# Altium footprint library VEGG_PcbLib_ALT.PcbLib: 140 footprints (part 7 of 9)
Each footprint in its own frame and in the unit in brackets; x right, y up, seen from the top. Pads: shape width x height; smd on the part's side, far side on the other; paste and mask are expansions set on the pad; w line width, h text height; cw(c..) or ccw(c..) is an arc to the next point about the centre after c.
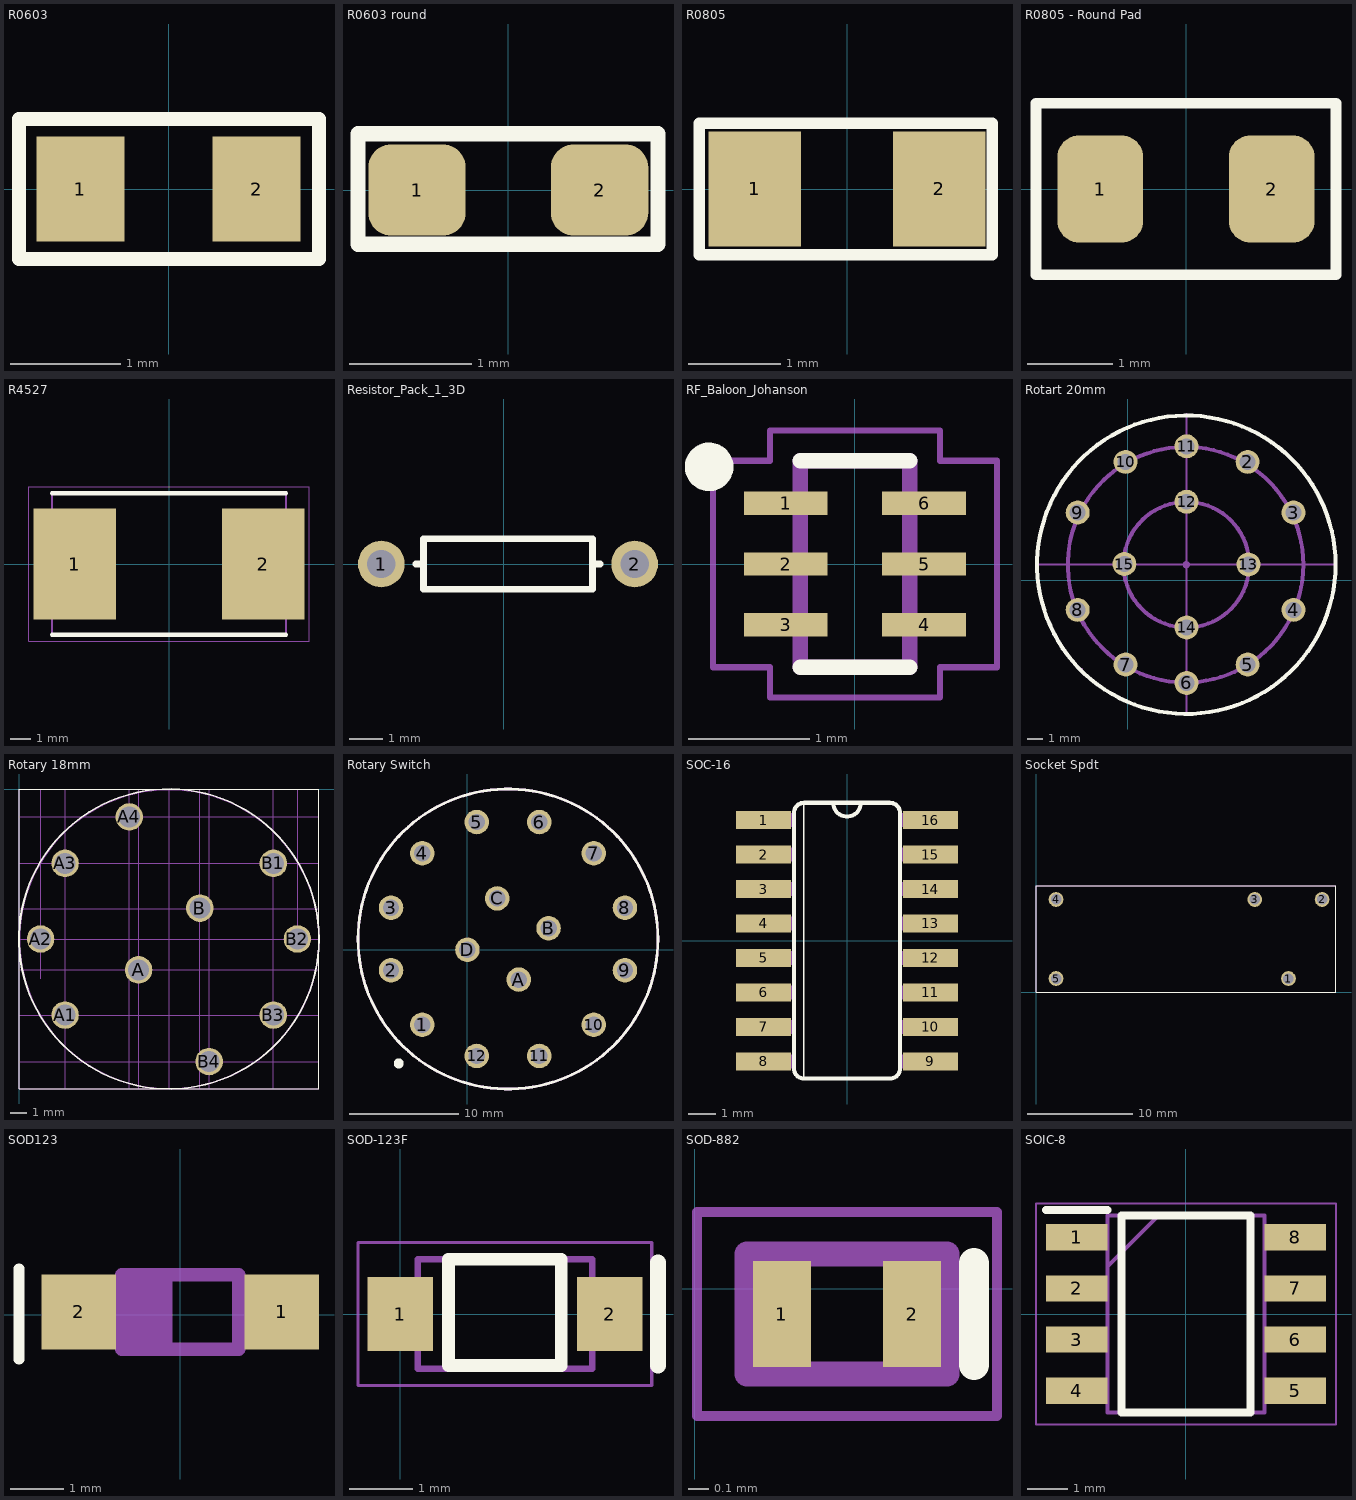
[diagram p6: the footprints below, top view; thin cyan lines are the x and y axes]

## R0603 [mm]
pads (2):
  rect 0.8x0.95 smd: 1(-0.8,0) 2(0.8,0)
Top Overlay:
  lines w0.125: -1.359,-0.635 -1.359,0.635 1.367,0.635 1.367,-0.635 -1.359,-0.635
3D body "SMD R-0603.STEP": height 0.45, standoff -0.01, extent -0.8,-0.4 0.8,0.4

## R0603 round [mm]
pads (2):
  rrect50% 0.8x0.75 smd: 1(-0.75,0) 2(0.75,0)
Top Overlay:
  lines w0.125: -1.235,-0.446 1.23,-0.446 1.23,0.463 -1.235,0.463 -1.235,-0.446
3D body "SMD R-0603.STEP": height 0.45, standoff -0.01, extent -0.8,-0.4 0.8,0.4

## R0805 [mm]
pads (2):
  rect 1x1.25 smd: 1(-1,0) 2(1,0)
Top Overlay:
  lines w0.125: -1.6,-0.711 1.575,-0.711 1.575,0.711 -1.6,0.711 -1.6,-0.711
3D body "R-0805.STEP": height 0.6, standoff 0, extent -1,-0.625 1,0.625

## R0805 - Round Pad [mm]
pads (2):
  rrect50% 1x1.25 smd: 1(-1,0) 2(1,0)
Top Overlay:
  lines w0.125: -1.75,-1 1.75,-1 1.75,1 -1.75,1 -1.75,-1
3D body "R-0805.STEP": height 0.6, standoff 0, extent -1,-0.625 1,0.625

## R4527 [mm]
pads (2):
  rect 4.05x5.5 smd: 1(-4.65,0) 2(4.65,0)
Top Overlay:
  lines w0.2: -5.78,-3.49 5.78,-3.49 ; -5.78,3.49 5.78,3.49
Mechanical 13:
  lines w0.1: -5.78,-3.49 -5.78,3.49 5.78,3.49 5.78,-3.49 -5.78,-3.49
Mechanical 15:
  lines w0.05: -6.925,-3.804 -6.925,3.804 6.925,3.804 6.925,-3.804 -6.925,-3.804
3D body "WSR5R0100FEA.stp": height 2.54, standoff 0, extent -5.78,-3.49 5.78,3.49

## Resistor_Pack_1_3D [mm] "Axial 0.3"
pads (2):
  round 1.4 hole 0.85: 1(-3.683,0) 2(3.937,0)
Top Overlay:
  lines w0.2: -2.642,0 -2.413,0 ; 2.896,0 2.667,0 ; 2.667,0 2.667,0.762 -2.413,0.762 -2.413,-0.762 2.667,-0.762 2.667,0
3D body "User Library-Resistencia-1.STEP": height 3.51, standoff 0, extent -3.937,-0.971 4.191,0.971

## RF_Baloon_Johanson [mm] "for M-Bus Project"
pads (6):
  rect 0.69x0.19 smd: 1(-0.57,0.5) 2(-0.57,0) 3(-0.57,-0.5) 4(0.57,-0.5) 5(0.57,0) 6(0.57,0.5)
Top Overlay:
  circle w0.2: c-1.2,0.8 r0.1
  lines w0.127: -0.45,-0.85 0.45,-0.85 ; -0.45,0.85 0.45,0.85
Mechanical 4:
  lines w0.127: -0.45,-0.85 -0.45,0.85 ; -0.45,-0.85 0.45,-0.85 ; -0.45,-0.85 -0.45,0.85 ; -0.45,-0.85 0.45,-0.85 ; -0.45,0.85 0.45,0.85 ; -0.45,0.85 0.45,0.85 ; 0.45,-0.85 0.45,0.85 ; 0.45,-0.85 0.45,0.85
Mechanical 16:
  lines w0.05: -1.17,-0.85 -0.7,-0.85 -0.7,-1.1 0.7,-1.1 0.7,-0.85 1.17,-0.85 1.17,0.85 0.7,0.85 0.7,1.1 -0.7,1.1 -0.7,0.85 -1.17,0.85 -1.17,-0.85
3D body: height 0.6, standoff 0, extent -0.406,-0.8 0.406,0.8

## Rotart 20mm [mil]
pads (14):
  round 60 hole 40: 2(300,297) 3(415,170) 4(415,-74) 5(300,-211) 6(147,-257) 7(-6,-211) 8(-126,-74) 9(-126,170) 10(-6,297) 11(147,336) 12(147,197) 13(302,40) 14(147,-118) 15(-9,41)
Top Overlay:
  circle w10: c146.41,39.23 r374.02
Mechanical 1:
  lines w5: -230,40 521,40 147,40 ; -116,-222 -115,-222 ; 146,40 147,40 ; 147,-335 147,417 147,40 ; 149,40 147,40 ; 412,-223 412,-221
Mechanical 15:
  circle w10: c146.41,39.23 r3.94
  circle w10: c146.41,39.23 r157.48
  circle w10: c144.41,39.23 r295.28
3D body: height 984.25, standoff 511.81, extent 46.56,-61.3 243.41,135.3
3D body: height 437.01, standoff 3.94, extent -229.03,-336.89 519,410.89
3D body: height 94.49, standoff 0, extent -297,345 -297,345
3D body: height 94.49, standoff 0, extent -249,388 -249,388
3D body: height 539.37, standoff 440.94, extent -112.9,-217.9 398.91,293.91

## Rotary 18mm [mil] "2 Pole 5 Position"
pads (10):
  round 65 hole 50: A(282,-427) A1(108,-534) A2(50,-354) A3(108,-175) A4(260,-65) B(427,-281) B1(601,-175) B2(658,-354) B3(601,-534) B4(449,-644)
Top Overlay:
  circle w3.94: c354,-354 r355
  lines w1: 0,-709 709,-709 709,0 0,0 0,-709
Mechanical 4:
  circle w3.94: c354.5,-354.5 r354.33
  lines w1: 0,-644 709,-644 ; 0,-534 709,-534 ; 0,-427 709,-427 ; 0,-354.5 709,-354.5 ; 0,-282 709,-282 ; 0,-175 709,-175 ; 0,-65 709,-65 ; 50,-448 50,0 ; 108,-709 108,0 ; 260,-709 260,0 ; 282,-709 282,0 ; 354.5,-709 354.5,0 ; 427,-709 427,0 ; 449,-709 449,0 ; 601,-709 601,0 ; 659,-367 659,0 ; 0,-709 0,0 709,0 709,-709 0,-709
3D body: height 379, standoff 5, extent -0.99,-707.87 707.01,-0.12

## Rotary Switch [mm] "2x6 position"
pads (16):
  round 2.25 hole 1.5: 1(-4.13,-6.852) 2(-7.003,-1.876) 3(-7.003,3.869) 4(-4.13,8.845) 5(0.846,11.718) 6(6.592,11.718) 7(11.568,8.845) 8(14.441,3.869) 9(14.441,-1.876) 10(11.568,-6.852) 11(6.592,-9.725) 12(0.846,-9.725) A(4.715,-2.722) B(7.438,1.993) C(2.722,4.715) D(0,0)
Top Overlay:
  circle w0.254: c3.719,0.996 r13.75
  circle w0.5: c-6.3,-10.407 r0.204
Mechanical 15:
  circle w0.254: c3.719,0.996 r13.75
3D body "Stufenschalter 2x6.step": height 62.8, standoff -4, extent -14.1,-16.975 21.684,18.811

## SOC-16 [mil]
height 51.18
pads (16):
  rect 80x26 smd: 1(-121,175) 2(-121,125) 3(-121,75) 4(-121,25) 5(-121,-25) 6(-121,-75) 7(-121,-125) 8(-121,-175) 9(121,-175) 10(121,-125) 11(121,-75) 12(121,-25) 13(121,25) 14(121,75) 15(121,125) 16(121,175)
Top Overlay:
  lines w2: -63,-200 -63,200
  lines w6: -20,200 ccw(c0,200) 20,200 ; -77,-185 ccw(c-62,-185) -62,-200 62,-200 ccw(c62,-185) 77,-185 77,185 ccw(c62,185) 62,200 -62,200 ccw(c-62,185) -77,185 -77,-185
Mechanical 4:
  region: 122,-165 122,-185 77,-185 77,-165
  region: 122,-115 122,-135 77,-135 77,-115
  region: 122,-65 122,-85 77,-85 77,-65
  region: 122,-15 122,-35 77,-35 77,-15
  region: -77,-165 -77,-185 -122,-185 -122,-165
  region: -77,-115 -77,-135 -122,-135 -122,-115
  region: -77,-65 -77,-85 -122,-85 -122,-65
  region: -77,-15 -77,-35 -122,-35 -122,-15
  region: 122,185 122,165 77,165 77,185
  region: 122,135 122,115 77,115 77,135
  region: 122,85 122,65 77,65 77,85
  region: -77,35 -77,15 -122,15 -122,35
  region: -76,85 -76,65 -121,65 -121,85
  region: -77,135 -77,115 -122,115 -122,135
  region: -77,185 -77,165 -122,165 -122,185
  region: 122,35 122,15 77,15 77,35
  region: 122,-165 122,-185 77,-185 77,-165
  region: 122,-115 122,-135 77,-135 77,-115
  region: 122,-65 122,-85 77,-85 77,-65
  region: 122,-15 122,-35 77,-35 77,-15
  region: -77,-165 -77,-185 -122,-185 -122,-165
  region: -77,-115 -77,-135 -122,-135 -122,-115
  region: -77,-65 -77,-85 -122,-85 -122,-65
  region: -77,-15 -77,-35 -122,-35 -122,-15
  region: 122,185 122,165 77,165 77,185
  region: 122,135 122,115 77,115 77,135
  region: 122,85 122,65 77,65 77,85
  region: -77,35 -77,15 -122,15 -122,35
  region: -76,85 -76,65 -121,65 -121,85
  region: -77,135 -77,115 -122,115 -122,135
  region: -77,185 -77,165 -122,165 -122,185
  region: 122,35 122,15 77,15 77,35
3D body "CD4017 SOIC-16.STEP": height 76.81, standoff 0, extent -113.85,-188.9 130.25,205.58
3D body "CD4017 SOIC-16.STEP": height 76.81, standoff 0, extent -118.05,-198.48 126.05,196

## Socket Spdt [mm] "RY211005"
pads (5):
  round 1.4 hole 1: 1(24.003,1.321) 2(27.203,8.839) 3(20.803,8.839) 4(1.905,8.839) 5(1.905,1.321)
Top Overlay:
  lines w0.025: 0,0 28.524,0 28.524,10.16 0,10.16 0,0
Mechanical 1:
  lines w0.025: 0,0 28.524,0 28.524,10.16 0,10.16 0,0
3D body "c-4-1393224-2-a-3d.stp": height 12.3, standoff -3.2, extent 0.012,0.03 28.512,10.13

## SOD123 [mm]
pads (2):
  rect 1.4x1.4 smd: 1(1.9,0.051) 2(-1.9,0.051)
Top Overlay:
  lines w0.2: -3.023,-0.838 -3.023,0.864
Mechanical 4:
  region: -1.05,0.751 -0.15,0.751 -0.15,-0.599 -1.05,-0.599
  region: 1.201,0.451 1.95,0.451 1.95,-0.4 1.201,-0.4
  region: -1.952,0.451 -1.2,0.451 -1.2,-0.4 -1.952,-0.4
  region: -1.05,0.751 -0.15,0.751 -0.15,-0.599 -1.05,-0.599
  region: 1.201,0.451 1.95,0.451 1.95,-0.4 1.201,-0.4
  region: -1.952,0.451 -1.2,0.451 -1.2,-0.4 -1.952,-0.4
  lines w0.254: -1.1,-0.649 -1.1,0.751 ; -1.1,-0.649 1.1,-0.649 ; -1.1,-0.649 -1.1,0.751 ; -1.1,-0.649 1.1,-0.649 ; -1.1,0.751 1.1,0.751 ; -1.1,0.751 1.1,0.751 ; 1.1,-0.649 1.1,0.751 ; 1.1,-0.649 1.1,0.751
3D body "sod123 v4.step": height 1.2, standoff 0, extent -1.875,-0.787 1.875,0.913

## SOD-123F [mm]
pads (2):
  rect 1.03x1.17 smd: 1(0.001,0) 2(3.301,0)
Top Overlay:
  lines w0.2: 0.762,0.838 0.762,-0.813 2.54,-0.813 2.54,0.864 0.762,0.864
  lines w0.254: 4.064,-0.813 4.064,0.813
Mechanical 15:
  lines w0.1: 0.276,-0.862 3.026,-0.862 3.026,0.862 0.276,0.862 0.276,-0.862
Mechanical 20:
  lines w0.05: -0.664,-1.125 3.966,-1.125 3.966,1.125 -0.664,1.125 -0.664,-1.125
3D body "SOD-123FL.SLDPRT": height 1.27, standoff -0.08, extent -0.274,-1.076 3.576,1.077

## SOD-882 [mm] "zener diode smd"
pads (2):
  rect 0.29x0.53 smd: 1(0.437,-0.127) 2(1.087,-0.127)
Top Overlay:
  lines w0.15: 1.397,-0.381 1.397,0.127
Mechanical 1:
  lines w0.127: 0.262,-0.427 1.262,-0.427 1.262,0.173 0.262,0.173 0.262,-0.427
Mechanical 4:
  lines w0.05: 0.012,-0.637 1.512,-0.637 1.512,0.383 0.012,0.383 0.012,-0.637
3D body "User Library-SOD882.SLDPRT": height 0.39, standoff -0.11, extent 0.251,-0.438 1.273,0.184

## SOIC-8 [mm]
pads (8):
  rect 1.525x0.65 smd: 1(-2.712,1.905) 2(-2.712,0.635) 3(-2.712,-0.635) 4(-2.712,-1.905) 5(2.712,-1.905) 6(2.712,-0.635) 7(2.712,0.635) 8(2.712,1.905)
Top Overlay:
  lines w0.2: -3.475,2.58 -1.95,2.58 ; -1.6,-2.45 1.6,-2.45 1.6,2.45 -1.6,2.45 -1.6,-2.45
Mechanical 13:
  lines w0.1: -1.95,1.18 -0.68,2.45 ; -1.95,-2.45 1.95,-2.45 1.95,2.45 -1.95,2.45 -1.95,-2.45
Mechanical 15:
  lines w0.05: -3.725,-2.75 3.725,-2.75 3.725,2.75 -3.725,2.75 -3.725,-2.75
3D body "NE555DR.stp": height 1.75, standoff 0, extent -3,-2.45 3,2.45